# Altium footprint library iuh-thuc-hanh.PcbLib: 72 footprints (part 3 of 5)
Each footprint in its own frame and in the unit in brackets; x right, y up, seen from the top. Pads: shape width x height; smd on the part's side, far side on the other; paste and mask are expansions set on the pad; w line width, h text height; cw(c..) or ccw(c..) is an arc to the next point about the centre after c.
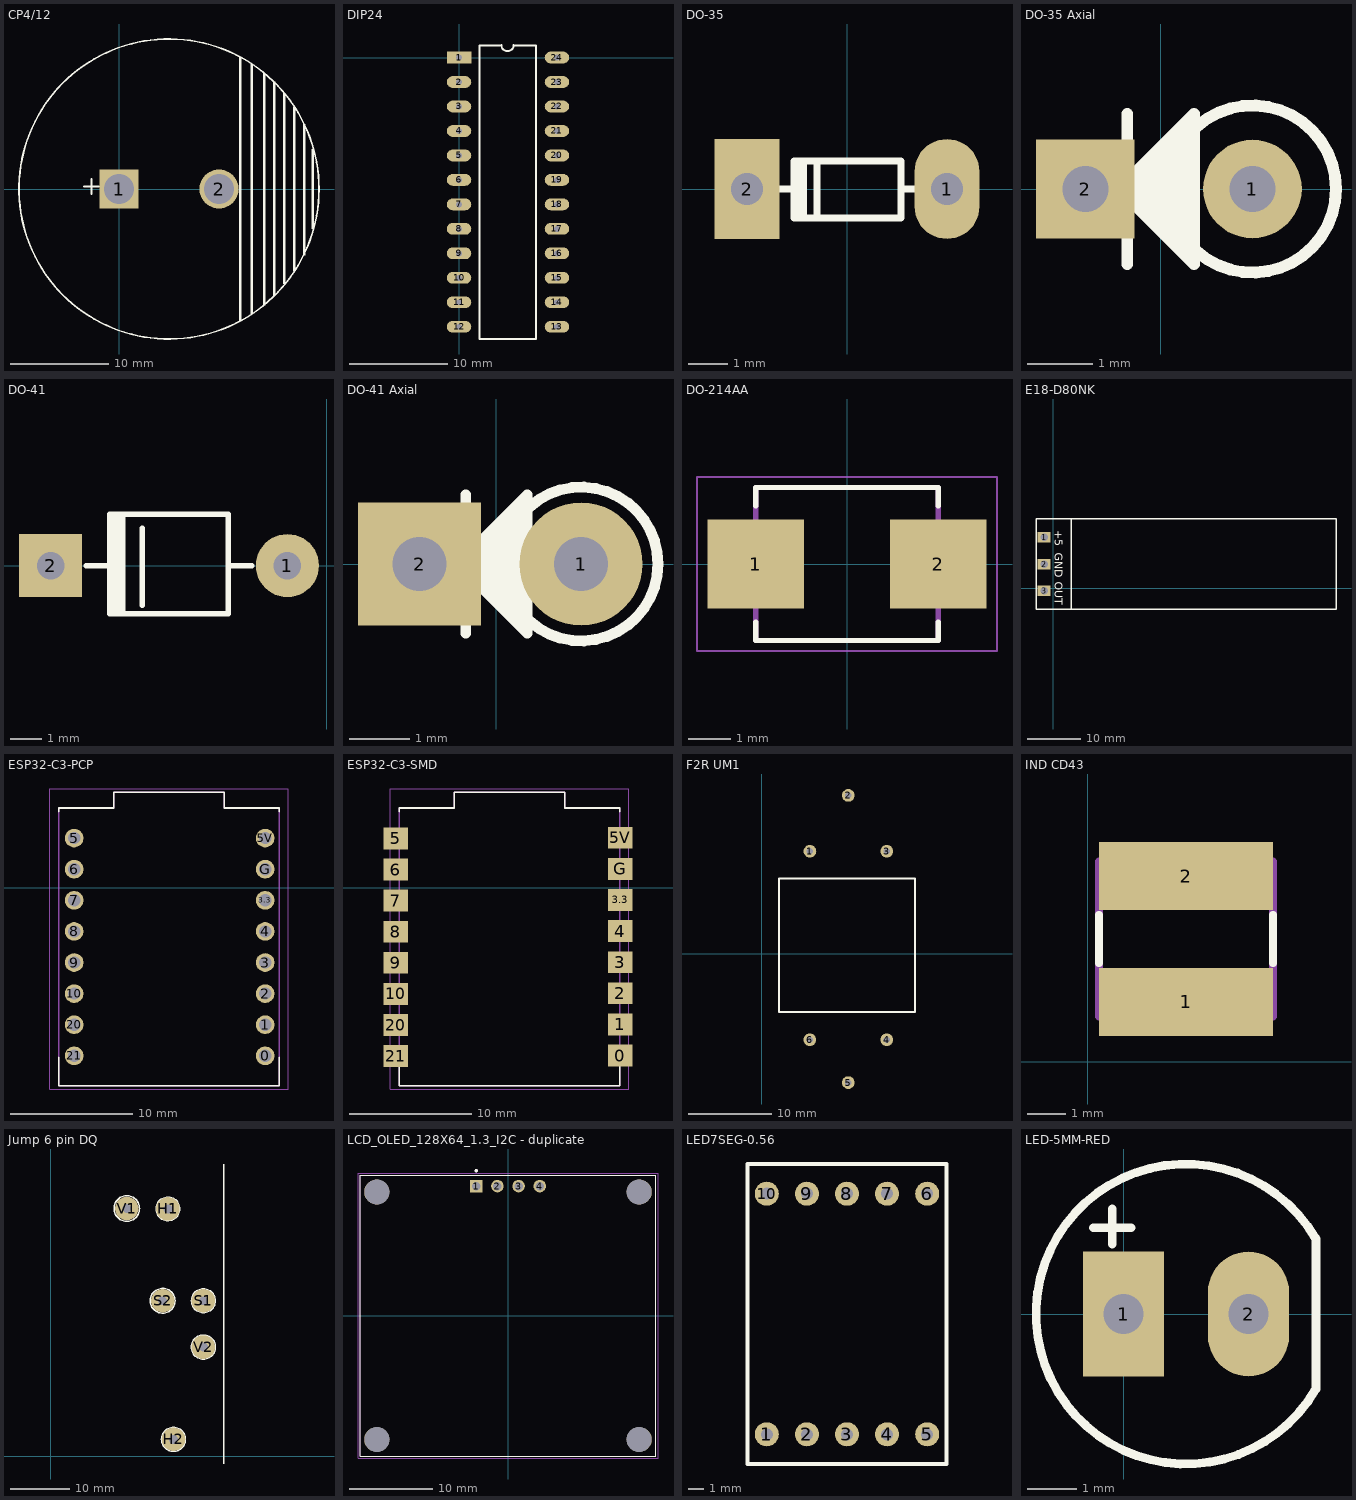
[diagram p2: the footprints below, top view; thin cyan lines are the x and y axes]

## CP4/12 [mm] "Tu hoa 220uF/450V"
height 15.24
pads (2):
  rect 4x4 hole 3: 1(0,0)
  round 4 hole 3: 2(10.16,0)
Top Overlay:
  circle w0.178: c5.08,0 r15.24
  rectangle: 19.558,-4.064 19.812,4.064
  rectangle: 18.669,-6.731 18.923,6.604
  rectangle: 12.192,-13.462 12.446,13.462
  rectangle: 13.335,-12.7 13.589,12.7
  rectangle: 14.605,-11.811 14.859,11.811
  rectangle: 15.621,-10.795 15.875,10.922
  rectangle: 16.637,-9.652 16.891,9.779
  rectangle: 17.653,-8.382 17.907,8.382
  lines w0.178: -3.556,0.254 -2.032,0.254 ; -2.794,-0.508 -2.794,1.016

## DIP24 [mm]
pads (24):
  rect 2.5x1.2 hole 0.6: 1(0,0)
  oval 2.5x1.2 hole 0.6: 2(0,-2.5) 3(0,-5) 4(0,-7.5) 5(0,-10) 6(0,-12.5) 7(0,-15) 8(0,-17.5) 9(0,-20) 10(0,-22.5) 11(0,-25) 12(0,-27.5) 13(10,-27.5) 14(10,-25) 15(10,-22.5) 16(10,-20) 17(10,-17.5) 18(10,-15) 19(10,-12.5) 20(10,-10) 21(10,-7.5) 22(10,-5) 23(10,-2.5) 24(10,0)
Top Overlay:
  lines w0.2: 4.328,1.25 2.085,1.25 2.085,-28.75 7.874,-28.75 7.874,1.25 5.588,1.25 ; 4.328,1.27 ccw(c4.953,1.27) 5.578,1.27

## DO-35 [mil] "Diode 0.5A"
height 80
pads (2):
  oval 65x100 hole 32: 1(100,0)
  rect 65x100 hole 32: 2(-100,0)
Top Overlay:
  rectangle: -55,-30 -40,25
  lines w7: -80,0 -53,0 ; -30,-29 -30,28 ; 54,0 80,0 ; -53,-29 54,-29 54,28 -53,28 -53,-29
3D body "SW3dPS-1N4148.STEP": height 61.22, standoff -50, extent -108.5,-32.96 108.5,32

## DO-35 Axial [mm] "Diode 0.5A Axial"
height 2.54
pads (2):
  round 1.5 hole 0.7: 1(1.397,0)
  rect 1.5x1.5 hole 0.7: 2(-1.143,0)
Top Overlay:
  circle w0.178: c1.397,0 r1.27
  region: 0.508,1.016 0.508,-1.016 0.381,-1.016 -0.508,-0.127 -0.508,0.127
  lines w0.178: -0.762,0 -0.508,0 ; -0.508,-1.143 -0.508,1.143 ; -0.508,-0.127 -0.508,0.127 0.508,1.143 0.508,-1.143 -0.508,-0.127

## DO-41 [mil] "Diode 1A"
height 100
pads (2):
  round 80 hole 35: 1(-50,0)
  rect 80x80 hole 35: 2(-350,0)
Top Overlay:
  rectangle: -275,-60.98 -255,65
  lines w7: -305,0 -275,0 ; -275,-16 -275,0 ; -275,21 -275,0 ; -234,-50 -234,47 ; -125,0 -95,0 ; -275,0 -275,65 -125,65 -125,-60.98 -275,-60.98 -275,0
3D body "User Library-DO-15-1.step": height 122.05, standoff -137.8, extent -365.75,-60.98 -34.25,65

## DO-41 Axial [mil] "Diode 1A Axial"
height 100
pads (2):
  round 80 hole 35: 1(55,0)
  rect 80x80 hole 35: 2(-50,0)
Top Overlay:
  circle w7: c55,0 r50
  region: 20,40 20,-40 15,-40 -20,-5 -20,5
  lines w7: -30,0 -20,0 ; -20,-45 -20,45 ; -20,-5 -20,5 20,45 20,-45 -20,-5

## DO-214AA [mm]
pads (2):
  rect 2.28x2.12 smd: 1(-2.165,0) 2(2.165,0)
Top Overlay:
  lines w0.127: -2.163,-1.38 -2.163,-1.813 2.163,-1.813 2.163,-1.38 ; -2.163,1.38 -2.163,1.813 2.163,1.813 2.163,1.38
Mechanical 13:
  lines w0.127: -2.163,-1.813 -2.163,1.813 2.163,1.813 2.163,-1.813 -2.163,-1.813
Mechanical 15:
  lines w0.05: -3.555,-2.063 -3.555,2.063 3.555,2.063 3.555,-2.063 -3.555,-2.063
3D body "step_temp.STEP": height 2.65, standoff 0, extent -2.675,-1.813 2.675,1.813

## E18-D80NK [mm] "Cam bien khoang cach hong ngoai"
pads (3):
  rect 2.5x2 hole 1.4: 1(-1.778,9.652) 2(-1.778,4.572) 3(-1.778,-0.508)
Top Overlay:
  lines w0.254: 3.34,-3.919 3.34,13.081 ; -3.302,-3.919 53.34,-3.919 53.34,13.081 -3.302,13.081 -3.302,-3.919
  text "GND" at 0.254,6.667 h1.52
  text "+5" at 0.254,10.922 h1.52
  text "OUT" at 0.254,1.27 h1.52
3D body "Proximity Sensor E18-D.step": height 21.65, standoff -1.65, extent -3.127,-6.951 53.173,16.349

## ESP32-C3-PCP [mil]
pads (16):
  round 60 hole 39.37: 0(2964.17,-540) 1(2964.17,-440) 2(2964.17,-340) 3(2964.17,-240) 3.3(2964.17,-40) 4(2964.17,-140) 5(2350,160) 5V(2964.17,160) 6(2350,60) 7(2350,-40) 8(2350,-140) 9(2350,-240) 10(2350,-340) 20(2350,-440) 21(2350,-540) G(2964.17,60)
Top Overlay:
  lines w5: 2300.67,-544.33 2300.67,-636.85 3009.33,-636.85 3009.33,-544.33 ; 2300.67,245.04 2300.67,256.85 2477.83,256.85 2477.83,308.03 2832.17,308.03 2832.17,256.85 3009.33,256.85 3009.33,245.04
Mechanical 13:
  lines w5: 2300.67,-636.85 3009.33,-636.85 3009.33,256.85 2832.17,256.85 2832.17,308.03 2477.83,308.03 2477.83,256.85 2300.67,256.85 2300.67,-636.85
Mechanical 15:
  lines w1.97: 2271.24,-646.69 3038.76,-646.69 3038.76,317.87 2271.24,317.87 2271.24,-646.69
3D body "ESP32-C3 SuperMini--3DModel-STEP-56544.STEP": height 163.79, standoff 0, extent 2295.67,-671.85 3004.33,273.03

## ESP32-C3-SMD [mil]
pads (16):
  rect 80x70 smd: 0(3011,-539) 1(3011,-439) 2(3011,-339) 3(3011,-239) 3.3(3011,-39) 4(3011,-139) 5(2289,159) 5V(3011,161) 6(2289,59) 7(2289,-41) 8(2289,-141) 9(2289,-241) 10(2289,-341) 20(2289,-441) 21(2289,-541) G(3011,61)
Top Overlay:
  lines w5: 2300.67,-544.33 2300.67,-636.85 3009.33,-636.85 3009.33,-544.33 ; 2300.67,245.04 2300.67,256.85 2477.83,256.85 2477.83,308.03 2832.17,308.03 2832.17,256.85 3009.33,256.85 3009.33,245.04
Mechanical 13:
  lines w5: 2300.67,-636.85 3009.33,-636.85 3009.33,256.85 2832.17,256.85 2832.17,308.03 2477.83,308.03 2477.83,256.85 2300.67,256.85 2300.67,-636.85
Mechanical 15:
  lines w1.97: 2271.24,-646.69 3038.76,-646.69 3038.76,317.87 2271.24,317.87 2271.24,-646.69
3D body "ESP32-C3 SuperMini--3DModel-STEP-56544.STEP": height 163.79, standoff 0, extent 2295.67,-674.88 3004.33,270

## F2R UM1 [mil]
pads (6):
  round 60 hole 30: 1(227.79,482.5) 2(408.58,745.59) 3(590,482.5) 4(589.71,-405) 5(408.58,-606.85) 6(227.5,-405)
Top Overlay:
  lines w10: 82.5,-275 722.5,-275 722.5,337.5 722.5,355 82.5,355 82.5,-275
3D body: height 314.96, standoff 0, extent 77.5,-275 720,357.5

## IND CD43 [mm]
pads (2):
  rect 4.5x1.75 smd: 1(2.54,1.55) 2(2.54,4.8)
Top Overlay:
  lines w0.2: 0.29,2.55 0.29,3.8 ; 4.79,2.55 4.79,3.8
Mechanical 13:
  lines w0.2: 0.29,1.175 0.29,5.175 4.79,5.175 4.79,1.175 0.29,1.175
3D body "SMD_Inductor_CD43.step": height 3.22, standoff -0.01, extent 0.54,0.925 4.54,5.425

## Jump 6 pin DQ [mm]
pads (6):
  round 4 hole 1.5: H1(19.875,42.037) H2(20.828,2.857) S1(25.908,26.416) S2(18.986,26.416) V1(12.89,42.1) V2(25.908,18.542)
Top Overlay:
  circle w0.254: c12.89,42.1 r2.172
  circle w0.254: c19.875,42.037 r2.005
  circle w0.254: c18.986,26.416 r2.111
  circle w0.254: c25.908,26.416 r2.032
  circle w0.254: c25.908,18.542 r2.048
  circle w0.254: c20.828,2.857 r2.041
  lines w0.254: 29.41,-1.333 29.41,49.666

## LCD_OLED_128X64_1.3_I2C - duplicate [mm]
pads (8):
  rect 1.508x1.508 / inner round 1.508 / far side rect 1.508x1.508 hole 1: 1(-3.81,15.55)
  round 1.508 hole 1: 2(-1.27,15.55) 3(1.27,15.55) 4(3.81,15.55)
  round 3 hole 3 unplated: ""(-15.75,-14.85) ""(-15.75,14.85) ""(15.75,-14.85) ""(15.75,14.85)
Top Overlay:
  circle w0.2: c-3.81,17.4 r0.1
  lines w0.127: -17.75,-16.85 17.75,-16.85 17.75,16.85 -17.75,16.85 -17.75,-16.85
Mechanical 13:
  circle w0.2: c-3.81,17.4 r0.1
  lines w0.127: -17.75,-16.85 17.75,-16.85 17.75,16.85 -17.75,16.85 -17.75,-16.85
Mechanical 15:
  lines w0.05: -18,-17.1 -18,17.1 18,17.1 18,-17.1 -18,-17.1
3D body "AZ-Delivery - OLED13 IIC.stp": height 2.1, standoff -9.1, extent -17.637,-16.133 17.764,17.367

## LED7SEG-0.56 [mil]
pads (10):
  round 60 hole 30: 1(-2778.56,5986.53) 2(-2678.56,5986.53) 3(-2578.56,5986.53) 4(-2478.56,5986.53) 5(-2378.56,5986.53) 6(-2378.56,6586.53) 7(-2478.56,6586.53) 8(-2578.56,6586.53) 9(-2678.56,6586.53) 10(-2778.56,6586.53)
Top Overlay:
  lines w10: -2826.59,5912.52 -2826.59,6660.55 -2330.53,6660.55 -2330.53,5912.52 -2826.59,5912.52
3D body "Led 7 Segment 5611AS Red CC.STEP": height 314.96, standoff -78.74, extent -2823.03,5911.97 -2326.97,6660

## LED-5MM-RED [mil] "LED 2 PIN, 5mm, Only colour,pin to pin 100mil"
height 300
pads (2):
  rect 65x100 hole 32: 1(0,0)
  oval 65x100 hole 32: 2(100,0)
Top Overlay:
  lines w7: -24,69 6,69 ; -9,56 -9,84 ; 153.51,60.71 ccw(c50,0) 153.94,-59.97 ; 154,-59 154,60
3D body "SW3dPS-LEDd5R.STEP": height 339.18, standoff -243.49, extent -64.69,-119 148.69,117.99